# Altium footprint library ic.PcbLib: 116 footprints (part 5 of 8)
Each footprint in its own frame and in the unit in brackets; x right, y up, seen from the top. Pads: shape width x height; smd on the part's side, far side on the other; paste and mask are expansions set on the pad; w line width, h text height; cw(c..) or ccw(c..) is an arc to the next point about the centre after c.
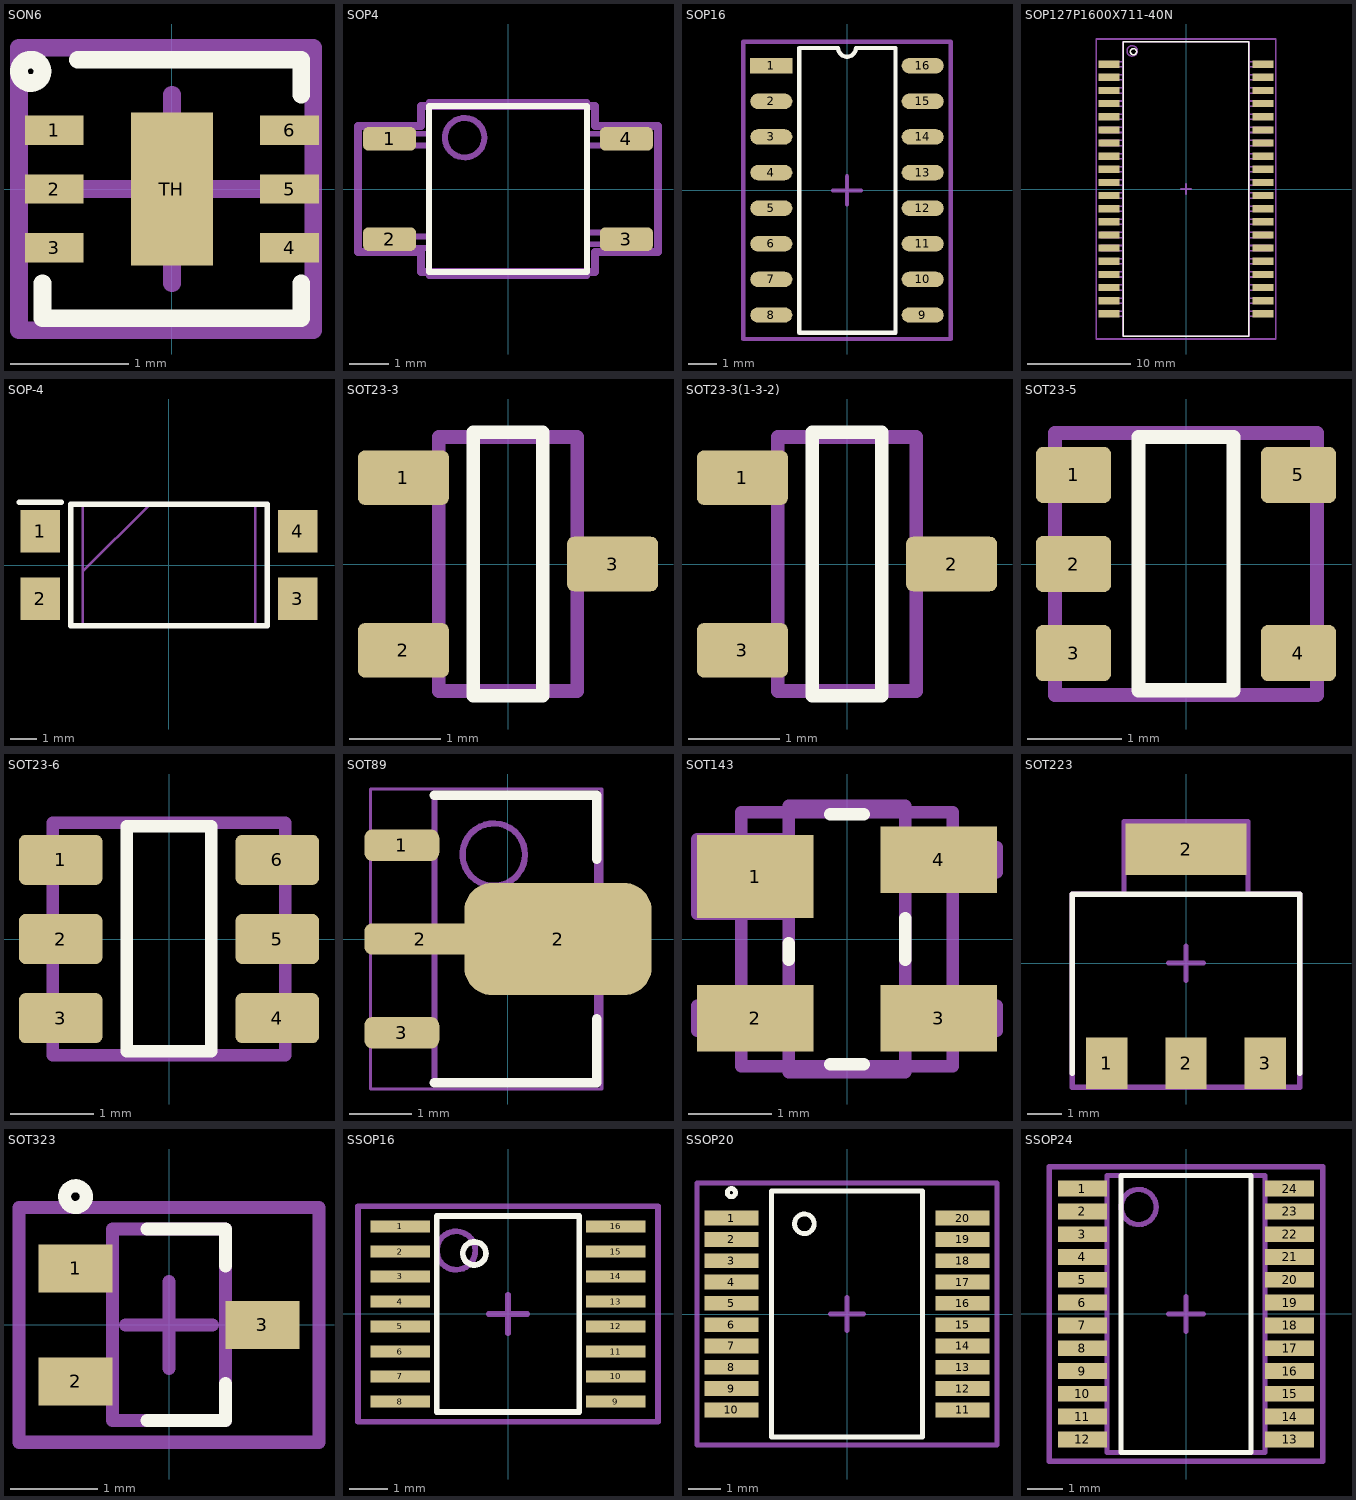
[diagram p4: the footprints below, top view; thin cyan lines are the x and y axes]

## SON6 [mm]
height 1
pads (7):
  rect 0.5x0.25 smd: 1(-1,0.5) 2(-1,0) 3(-1,-0.5) 4(1,-0.5) 5(1,0) 6(1,0.5)
  rect 0.7x1.3 smd: TH(0,0)
Top Overlay:
  circle w0.15: c-1.2,1 r0.1
  lines w0.15: -1.1,-0.8 -1.1,-1.1 1.1,-1.1 1.1,-0.8 ; -0.8,1.1 1.1,1.1 1.1,0.8
Top Courtyard:
  lines w0.15: -0.8,0 0,0 ; 0,-0.8 0,0 ; 0,0.8 0,0 ; 0.8,0 0,0 ; -1.3,-1.2 -1.3,1.2 1.2,1.2 1.2,-1.2 -1.3,-1.2
3D body: height 0.8, standoff 0, extent -1,-1 1,1

## SOP4 [mm] "SOP, 4-Leads, Body 4,00x3,79mm, Pitch 2,54mm, IPC High Density"
height 2.19
pads (4):
  rrect50% 1.35x0.6 smd: 1(-3,1.27) 2(-3,-1.27) 3(3,-1.27) 4(3,1.27)
Top Overlay:
  lines w0.15: -2,-2.1 2,-2.1 2,2.1 -2,2.1 -2,-2.1
  text "." at -3.175,2.1 h0.1
Top Courtyard:
  lines w0.2: -3.8,-1.6 -2.2,-1.6 -2.2,-2.1 0,-2.1 2.2,-2.1 2.2,-1.6 3.8,-1.6 3.8,0 3.8,1.6 2.2,1.6 2.2,2.1 0,2.1 -2.2,2.1 -2.2,1.6 -3.8,1.6 -3.8,0 -3.8,-1.6
Mechanical 29:
  circle w0.15: c-1.1,1.3 r0.5
  lines w0.15: -2,-1.5 -3.1,-1.5 -3.1,-1.2 -2,-1.2 ; -2,1.1 -3.1,1.1 -3.1,1.4 -2,1.4 ; 2,-1.4 3.1,-1.4 3.1,-1.1 2,-1.1 ; 2,1.1 3.1,1.1 3.1,1.4 2,1.4 ; -2,-2.2 2,-2.2 2,2.2 -2,2.2 -2,-2.2
  text ".Designator" at -1.8,-0.5 h1
3D body "SOP4.step": height 2.18, standoff 0, extent -3.025,-2.1 3.025,2.1

## SOP16 [mm]
pads (16):
  rect 1.5x0.55 smd: 1(-2.7,4.445)
  oval 1.5x0.55 smd: 2(-2.7,3.175) 3(-2.7,1.905) 4(-2.7,0.635) 5(-2.7,-0.635) 6(-2.7,-1.905) 7(-2.7,-3.175) 8(-2.7,-4.445) 9(2.7,-4.445) 10(2.7,-3.175) 11(2.7,-1.905) 12(2.7,-0.635) 13(2.7,0.635) 14(2.7,1.905) 15(2.7,3.175) 16(2.7,4.445)
Top Overlay:
  lines w0.15: -1.7,-5.08 1.725,-5.08 1.725,5.08 0.318,5.08 cw(c0,5.08) -0.318,5.08 -1.7,5.08 -1.7,-5.08
  text "." at -2.7,5.145 h0.1
Top Courtyard:
  lines w0.15: -0.5,0 0.5,0 ; 0,-0.5 0,0.5 ; -3.7,-5.3 3.7,-5.3 3.7,5.3 -3.7,5.3 -3.7,-5.3
3D body "SOIC16.STEP": height 1.75, standoff 0, extent -3.1,-4.955 3.1,4.945

## SOP127P1600X711-40N [mm] "SOP, 40-Leads, Body 28,50x12,19mm, Pitch 1,27mm, IPC Medium Density"
height 7.11
pads (40):
  rect 2x0.7 smd: 1(-7.45,12.065) 2(-7.45,10.795) 3(-7.45,9.525) 4(-7.45,8.255) 5(-7.45,6.985) 6(-7.45,5.715) 7(-7.45,4.445) 8(-7.45,3.175) 9(-7.45,1.905) 10(-7.45,0.635) 11(-7.45,-0.635) 12(-7.45,-1.905) 13(-7.45,-3.175) 14(-7.45,-4.445) 15(-7.45,-5.715) 16(-7.45,-6.985) 17(-7.45,-8.255) 18(-7.45,-9.525) 19(-7.45,-10.795) 20(-7.45,-12.065) 21(7.45,-12.065) 22(7.45,-10.795) 23(7.45,-9.525) 24(7.45,-8.255) 25(7.45,-6.985) 26(7.45,-5.715) 27(7.45,-4.445) 28(7.45,-3.175) 29(7.45,-1.905) 30(7.45,-0.635) 31(7.45,0.635) 32(7.45,1.905) 33(7.45,3.175) 34(7.45,4.445) 35(7.45,5.715) 36(7.45,6.985) 37(7.45,8.255) 38(7.45,9.525) 39(7.45,10.795) 40(7.45,12.065)
Top Overlay:
  circle w0.15: c-5.075,13.275 r0.3
  lines w0.15: -6.05,-14.25 -6.05,14.25 6.05,14.25 6.05,-14.25 -6.05,-14.25
  text "." at -7.505,12.959 h0.1
Top Courtyard:
  lines w0.15: -0.5,0 0.5,0 ; 0,-0.5 0,0.5 ; -8.675,-14.5 -8.675,14.5 8.675,14.5 8.675,-14.5 -8.675,-14.5
Mechanical 29:
  circle w0.15: c-5.2,13.35 r0.5
  lines w0.15: -6.096,-12.319 -8.255,-12.319 -8.255,-11.811 -6.096,-11.811 ; -6.096,-11.049 -8.255,-11.049 -8.255,-10.541 -6.096,-10.541 ; -6.096,-9.779 -8.255,-9.779 -8.255,-9.271 -6.096,-9.271 ; -6.096,-8.509 -8.255,-8.509 -8.255,-8.001 -6.096,-8.001 ; -6.096,-7.239 -8.255,-7.239 -8.255,-6.731 -6.096,-6.731 ; -6.096,-5.969 -8.255,-5.969 -8.255,-5.461 -6.096,-5.461 ; -6.096,-4.699 -8.255,-4.699 -8.255,-4.191 -6.096,-4.191 ; -6.096,-3.429 -8.255,-3.429 -8.255,-2.921 -6.096,-2.921 ; -6.096,-2.159 -8.255,-2.159 -8.255,-1.651 -6.096,-1.651 ; -6.096,-0.889 -8.255,-0.889 -8.255,-0.381 -6.096,-0.381 ; -6.096,0.381 -8.255,0.381 -8.255,0.889 -6.096,0.889 ; -6.096,1.651 -8.255,1.651 -8.255,2.159 -6.096,2.159 ; -6.096,2.921 -8.255,2.921 -8.255,3.429 -6.096,3.429 ; -6.096,4.191 -8.255,4.191 -8.255,4.699 -6.096,4.699 ; -6.096,5.461 -8.255,5.461 -8.255,5.969 -6.096,5.969 ; -6.096,6.731 -8.255,6.731 -8.255,7.239 -6.096,7.239 ; -6.096,8.001 -8.255,8.001 -8.255,8.509 -6.096,8.509 ; -6.096,9.271 -8.255,9.271 -8.255,9.779 -6.096,9.779 ; -6.096,10.541 -8.255,10.541 -8.255,11.049 -6.096,11.049 ; -6.096,11.811 -8.255,11.811 -8.255,12.319 -6.096,12.319 ; 6.096,-12.319 8.255,-12.319 8.255,-11.811 6.096,-11.811 ; 6.096,-11.049 8.255,-11.049 8.255,-10.541 6.096,-10.541 ; 6.096,-9.779 8.255,-9.779 8.255,-9.271 6.096,-9.271 ; 6.096,-8.509 8.255,-8.509 8.255,-8.001 6.096,-8.001 ; 6.096,-7.239 8.255,-7.239 8.255,-6.731 6.096,-6.731 ; 6.096,-5.969 8.255,-5.969 8.255,-5.461 6.096,-5.461 ; 6.096,-4.699 8.255,-4.699 8.255,-4.191 6.096,-4.191 ; 6.096,-3.429 8.255,-3.429 8.255,-2.921 6.096,-2.921 ; 6.096,-2.159 8.255,-2.159 8.255,-1.651 6.096,-1.651 ; 6.096,-0.889 8.255,-0.889 8.255,-0.381 6.096,-0.381 ; 6.096,0.381 8.255,0.381 8.255,0.889 6.096,0.889 ; 6.096,1.651 8.255,1.651 8.255,2.159 6.096,2.159 ; 6.096,2.921 8.255,2.921 8.255,3.429 6.096,3.429 ; 6.096,4.191 8.255,4.191 8.255,4.699 6.096,4.699 ; 6.096,5.461 8.255,5.461 8.255,5.969 6.096,5.969 ; 6.096,6.731 8.255,6.731 8.255,7.239 6.096,7.239 ; 6.096,8.001 8.255,8.001 8.255,8.509 6.096,8.509 ; 6.096,9.271 8.255,9.271 8.255,9.779 6.096,9.779 ; 6.096,10.541 8.255,10.541 8.255,11.049 6.096,11.049 ; 6.096,11.811 8.255,11.811 8.255,12.319 6.096,12.319 ; -6.1,-14.25 -6.1,14.25 6.1,14.25 6.1,-14.25 -6.1,-14.25
  text ".Designator" at -3.2,-0.5 h1
3D body: height 7.11, standoff 0.25, extent -6.1,-14.25 6.1,14.25

## SOP-4 [mm]
pads (4):
  rect 1.5x1.6 smd: 1(-4.85,1.27) 2(-4.85,-1.27) 3(4.85,-1.27) 4(4.85,1.27)
Top Overlay:
  lines w0.2: -5.65,2.37 -4.05,2.37 ; -3.7,-2.29 3.7,-2.29 3.7,2.29 -3.7,2.29 -3.7,-2.29
Mechanical 13:
  lines w0.1: -3.25,-0.25 -0.71,2.29 ; -3.25,-2.29 3.25,-2.29 3.25,2.29 -3.25,2.29 -3.25,-2.29
3D body "EL817_S1__C__TU_.stp": height 3.9, standoff 0, extent -5.15,-2.29 5.15,2.29

## SOT23-3 [mm] "SOT23, 3 pin"
height 1.003
pads (3):
  rrect25% 1x0.6 smd: 1(-1.15,0.95) 2(-1.15,-0.95) 3(1.15,0)
Top Overlay:
  lines w0.15: -0.381,-1.45 0.381,-1.45 0.381,1.45 -0.381,1.45 -0.381,-1.45
  text "." at -2.125,0.95 h0.1
Top Courtyard:
  lines w0.15: -0.762,-1.397 0.762,-1.397 0.762,1.397 -0.762,1.397 -0.762,-1.397
3D body "SOT23-3.STEP": height 1.29, standoff -0.01, extent -1.4,-1.45 1.4,1.45

## SOT23-3(1-3-2) [mm] "SOT23, 3 pin"
height 1.003
pads (3):
  rrect25% 1x0.6 smd: 1(-1.15,0.95) 2(1.15,0) 3(-1.15,-0.95)
Top Overlay:
  lines w0.15: -0.381,-1.45 0.381,-1.45 0.381,1.45 -0.381,1.45 -0.381,-1.45
  text "." at -2.125,0.95 h0.1
Top Courtyard:
  lines w0.15: -0.762,-1.397 0.762,-1.397 0.762,1.397 -0.762,1.397 -0.762,-1.397
3D body "SOT23-3.STEP": height 1.29, standoff -0.01, extent -1.4,-1.45 1.4,1.45

## SOT23-5 [mm]
height 1.6
pads (5):
  rrect25% 0.8x0.6 smd: 1(-1.2,0.95) 2(-1.2,0) 3(-1.2,-0.95) 4(1.2,-0.95) 5(1.2,0.95)
Top Overlay:
  lines w0.15: -0.508,-1.347 0.508,-1.347 0.508,1.353 -0.508,1.353 -0.508,-1.347
  text "." at -2.275,0.95 h0.1
Top Courtyard:
  lines w0.15: -1.397,-1.397 1.397,-1.397 1.397,1.397 -1.397,1.397 -1.397,-1.397
3D body "SOT23-5.STEP": height 1.44, standoff -0.01, extent -1.4,-1.45 1.4,1.45

## SOT23-6 [mm]
height 1.6
pads (6):
  rrect25% 1x0.6 smd: 1(-1.3,0.95) 2(-1.3,0) 3(-1.3,-0.95) 4(1.3,-0.95) 5(1.3,0) 6(1.3,0.95)
Top Overlay:
  lines w0.15: -0.508,-1.347 0.508,-1.347 0.508,1.353 -0.508,1.353 -0.508,-1.347
  text "." at -2.275,0.95 h0.1
Top Courtyard:
  lines w0.15: -1.397,-1.397 1.397,-1.397 1.397,1.397 -1.397,1.397 -1.397,-1.397
3D body "SOT23-6.STEP": height 1.44, standoff -0.01, extent -1.4,-1.45 1.4,1.45

## SOT89 [mm] "SOT89, 3-Leads, Body 4,50x2,45mm, Pitch 1,50mm, Lead Span 4,1mm, IPC High Density"
height 1.6
pads (4):
  rrect50% 1.2x0.5 smd: 1(-1.7,1.5) 3(-1.7,-1.5)
  rrect50% 1.8x0.5 smd: 2(-1.4,0)
  rrect50% 3x1.8 smd: 2(0.8,0)
Top Overlay:
  lines w0.15: -1.178,-2.3 1.422,-2.3 1.422,-1.275 ; -1.178,2.3 1.422,2.3 1.422,1.275
  text "." at -1.758,2.224 h0.1
Top Courtyard:
  lines w0.05: -2.2,-2.4 1.5,-2.4 1.5,2.4 -2.2,2.4 -2.2,-2.4
Top Assembly:
  circle w0.1: c-0.228,1.35 r0.5
  lines w0.1: -1.178,-2.3 -1.178,2.3 1.422,2.3 1.422,-2.3 -1.178,-2.3
3D body "SOT89.step": height 1.6, standoff 0, extent -2.2,-2.3 1.85,2.3

## SOT143 [mm] "SOT143, 4-Leads, Body 2,92x2,37mm, Pitch 1,90mm, IPC High Density"
height 1.2
pads (4):
  rect 1.4x1 smd: 1(-1.1,0.75)
  rect 1.4x0.8 smd: 2(-1.1,-0.95) 3(1.1,-0.95) 4(1.1,0.95)
Top Overlay:
  lines w0.15: -0.7,-0.25 -0.7,-0.05 ; -0.2,-1.5 0.2,-1.5 ; -0.2,1.5 0.2,1.5 ; 0.7,-0.25 0.7,0.25
  text "." at -1.651,1.816 h0.1
Top Courtyard:
  lines w0.15: -1.27,-1.524 1.27,-1.524 1.27,1.524 -1.27,1.524 -1.27,-1.524
Mechanical 29:
  lines w0.15: -0.7,-1.1 -1.8,-1.1 -1.8,-0.8 -0.7,-0.8 ; -0.7,0.3 -1.8,0.3 -1.8,1.2 -0.7,1.2 ; 0.7,-1.1 1.8,-1.1 1.8,-0.8 0.7,-0.8 ; 0.7,0.8 1.8,0.8 1.8,1.1 0.7,1.1 ; -0.7,-1.6 0.7,-1.6 0.7,1.6 -0.7,1.6 -0.7,-1.6
  text ".Designator" at -1.8,2 h1
3D body "SOT143.step": height 1.2, standoff 0.01, extent -1.179,-1.52 1.179,1.52

## SOT223 [mm]
pads (4):
  rect 1.2x1.5 smd: 1(-2.3,-2.9) 2(0,-2.9) 3(2.3,-2.9)
  rect 3.5x1.5 smd: 2(0,3.3)
Top Overlay:
  lines w0.15: -3.3,-3.2 -3.3,2 0,2 3.3,2 3.3,-3.2
  text "." at -3.6,-3.7 h0.1
Top Courtyard:
  lines w0.15: -0.5,0 0.5,0 ; 0,-0.5 0,0.5 ; -3.3,-3.6 3.3,-3.6 3.3,-2.6 3.3,2 1.8,2 1.8,4.1 -1.8,4.1 -1.8,2 -3.3,2 -3.3,-3.6
3D body "SW3dPS-SOT-223-1.STEP": height 1.64, standoff -0.01, extent -3.25,-3.398 3.25,3.602

## SOT323 [mm] "SOT323, 3-Leads, Body 2,00x2,10mm, Pitch 0,65mm, IPC Medium Density"
height 1.1
pads (3):
  rect 0.85x0.55 smd: 1(-1.075,0.65) 2(-1.075,-0.65) 3(1.075,0)
Top Overlay:
  circle w0.15: c-1.075,1.475 r0.125
  lines w0.15: -0.25,-1.1 0.65,-1.1 0.65,-0.675 ; -0.25,1.1 0.65,1.1 0.65,0.675
Top Courtyard:
  lines w0.15: -0.5,0 0.5,0 ; 0,-0.5 0,0.5 ; -1.725,-1.35 1.725,-1.35 1.725,1.35 -1.725,1.35 -1.725,-1.35
Mechanical 13:
  lines w0.15: -0.65,-1.1 0.65,-1.1 0.65,1.1 -0.65,1.1 -0.65,-1.1
3D body: height 1.1, standoff 0.1, extent -0.65,-1.1 0.65,1.1

## SSOP16 [mm]
height 1.2
pads (16):
  rect 1.55x0.3 smd: 1(-2.8,2.275) 2(-2.8,1.625) 3(-2.8,0.975) 4(-2.8,0.325) 5(-2.8,-0.325) 6(-2.8,-0.975) 7(-2.8,-1.625) 8(-2.8,-2.275) 9(2.8,-2.275) 10(2.8,-1.625) 11(2.8,-0.975) 12(2.8,-0.325) 13(2.8,0.325) 14(2.8,0.975) 15(2.8,1.625) 16(2.8,2.275)
Top Overlay:
  circle w0.15: c-0.875,1.575 r0.3
  lines w0.15: -1.85,-2.55 -1.85,2.55 1.85,2.55 1.85,-2.55 -1.85,-2.55
  text "." at -2.8,2.9 h0.1
Top Courtyard:
  lines w0.15: -0.5,0 0.5,0 ; 0,-0.5 0,0.5 ; -3.9,-2.8 -3.9,2.8 3.9,2.8 3.9,-2.8 -3.9,-2.8
Mechanical 13:
  circle w0.15: c-1.35,1.65 r0.5

## SSOP20 [mm] "SOP, 20-Leads, Body 7,20x5,29mm, Pitch 0,65mm, IPC Medium Density"
height 1.98
pads (20):
  rect 1.65x0.45 smd: 1(-3.525,2.925) 2(-3.525,2.275) 3(-3.525,1.625) 4(-3.525,0.975) 5(-3.525,0.325) 6(-3.525,-0.325) 7(-3.525,-0.975) 8(-3.525,-1.625) 9(-3.525,-2.275) 10(-3.525,-2.925) 11(3.525,-2.925) 12(3.525,-2.275) 13(3.525,-1.625) 14(3.525,-0.975) 15(3.525,-0.325) 16(3.525,0.325) 17(3.525,0.975) 18(3.525,1.625) 19(3.525,2.275) 20(3.525,2.925)
Top Overlay:
  circle w0.15: c-3.525,3.7 r0.125
  circle w0.15: c-1.3,2.75 r0.3
  lines w0.15: -2.3,-3.75 -2.3,3.75 2.3,3.75 2.3,-3.75 -2.3,-3.75
Top Courtyard:
  lines w0.15: -0.5,0 0.5,0 ; 0,-0.5 0,0.5 ; -4.575,-4 -4.575,4 4.575,4 4.575,-4 -4.575,-4
3D body "TSOP65P650X125-20N.step": height 1.25, standoff 0, extent -3.25,-3.25 3.25,3.25

## SSOP24 [mm] "TSOP, 24-Leads, Body 7,80x4,40mm, Pitch 0,65mm, IPC Medium Density"
height 1.1
pads (24):
  rect 1.4x0.45 smd: 1(-2.95,3.575) 2(-2.95,2.925) 3(-2.95,2.275) 4(-2.95,1.625) 5(-2.95,0.975) 6(-2.95,0.325) 7(-2.95,-0.325) 8(-2.95,-0.975) 9(-2.95,-1.625) 10(-2.95,-2.275) 11(-2.95,-2.925) 12(-2.95,-3.575) 13(2.95,-3.575) 14(2.95,-2.925) 15(2.95,-2.275) 16(2.95,-1.625) 17(2.95,-0.975) 18(2.95,-0.325) 19(2.95,0.325) 20(2.95,0.975) 21(2.95,1.625) 22(2.95,2.275) 23(2.95,2.925) 24(2.95,3.575)
Top Overlay:
  lines w0.15: -1.85,-3.95 -1.85,3.95 1.85,3.95 1.85,-3.95 -1.85,-3.95
  text "." at -3,4.3 h0.1
Top Courtyard:
  lines w0.15: -0.5,0 0.5,0 ; 0,-0.5 0,0.5 ; -3.9,-4.2 -3.9,4.2 3.9,4.2 3.9,-4.2 -3.9,-4.2
Mechanical 29:
  circle w0.15: c-1.35,3.05 r0.5
  lines w0.15: -2.25,-3.7 -3.5,-3.7 -3.5,-3.5 -2.25,-3.5 ; -2.25,-3 -3.5,-3 -3.5,-2.8 -2.25,-2.8 ; -2.25,-2.4 -3.5,-2.4 -3.5,-2.2 -2.25,-2.2 ; -2.25,-1.7 -3.5,-1.7 -3.5,-1.5 -2.25,-1.5 ; -2.25,-1.1 -3.5,-1.1 -3.5,-0.9 -2.25,-0.9 ; -2.25,-0.4 -3.5,-0.4 -3.5,-0.2 -2.25,-0.2 ; -2.25,0.2 -3.5,0.2 -3.5,0.4 -2.25,0.4 ; -2.25,0.9 -3.5,0.9 -3.5,1.1 -2.25,1.1 ; -2.25,1.5 -3.5,1.5 -3.5,1.7 -2.25,1.7 ; -2.25,2.2 -3.5,2.2 -3.5,2.4 -2.25,2.4 ; -2.25,2.8 -3.5,2.8 -3.5,3 -2.25,3 ; -2.25,3.5 -3.5,3.5 -3.5,3.7 -2.25,3.7 ; 2.25,-3.7 3.5,-3.7 3.5,-3.5 2.25,-3.5 ; 2.25,-3 3.5,-3 3.5,-2.8 2.25,-2.8 ; 2.25,-2.4 3.5,-2.4 3.5,-2.2 2.25,-2.2 ; 2.25,-1.7 3.5,-1.7 3.5,-1.5 2.25,-1.5 ; 2.25,-1.1 3.5,-1.1 3.5,-0.9 2.25,-0.9 ; 2.25,-0.4 3.5,-0.4 3.5,-0.2 2.25,-0.2 ; 2.25,0.2 3.5,0.2 3.5,0.4 2.25,0.4 ; 2.25,0.9 3.5,0.9 3.5,1.1 2.25,1.1 ; 2.25,1.5 3.5,1.5 3.5,1.7 2.25,1.7 ; 2.25,2.2 3.5,2.2 3.5,2.4 2.25,2.4 ; 2.25,2.8 3.5,2.8 3.5,3 2.25,3 ; 2.25,3.5 3.5,3.5 3.5,3.7 2.25,3.7 ; -2.25,-3.95 -2.25,3.95 2.25,3.95 2.25,-3.95 -2.25,-3.95
  text ".Designator" at -2,-0.4 h1